# Altium footprint library hphonglib.PcbLib: 1250 footprints (part 3 of 79)
Each footprint in its own frame and in the unit in brackets; x right, y up, seen from the top. Pads: shape width x height; smd on the part's side, far side on the other; paste and mask are expansions set on the pad; w line width, h text height; cw(c..) or ccw(c..) is an arc to the next point about the centre after c.
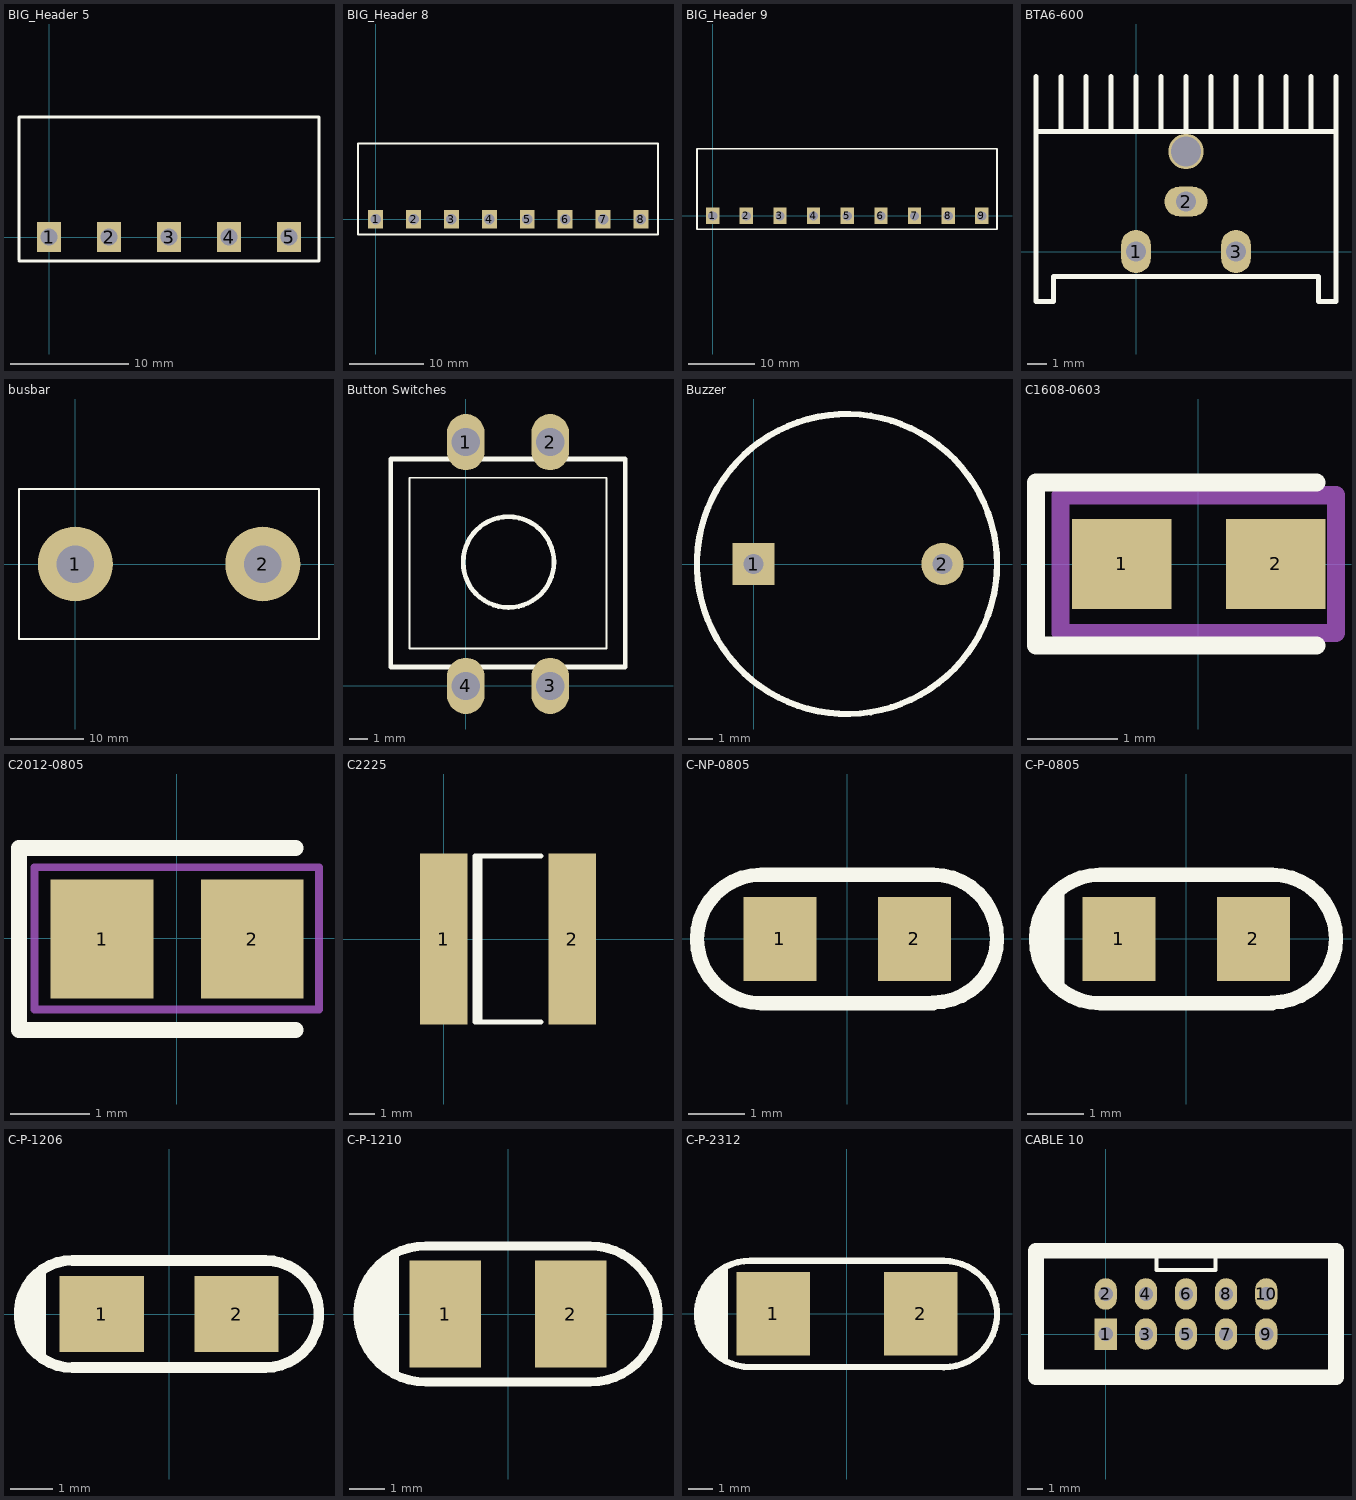
[diagram p2: the footprints below, top view; thin cyan lines are the x and y axes]

## BIG_Header 5 [mm]
pads (5):
  rect 2x2.5 hole 1.4: 1(0,0) 2(5.08,0) 3(10.16,0) 4(15.24,0) 5(20.32,0)
Top Overlay:
  lines w0.254: -2.54,-2.032 7.62,-2.032 22.86,-2.032 22.86,10.16 ; -2.54,-1.905 -2.54,10.16 ; -2.54,10.16 6.248,10.16 22.86,10.16 ; -2.54,10.16 22.86,10.16
3D body "User Library-BigHeader 5EHDR_1P.step": height 3.15, standoff -9.32, extent 17.82,-1.75 22.82,10.25
3D body "User Library-BigHeader 5EHDR_1P.step": height 3.15, standoff -9.32, extent 12.74,-1.75 17.74,10.25
3D body "User Library-BigHeader 5EHDR_1P.step": height 3.15, standoff -9.32, extent 7.66,-1.75 12.66,10.25
3D body "User Library-BigHeader 5EHDR_1P.step": height 3.15, standoff -9.32, extent 2.58,-1.75 7.58,10.25
3D body "User Library-BigHeader 5EHDR_1P.step": height 3.15, standoff -9.32, extent -2.5,-1.75 2.5,10.25

## BIG_Header 8 [mm]
pads (8):
  rect 2x2.5 hole 1.4: 1(0,0) 2(5.08,0) 3(10.16,0) 4(15.24,0) 5(20.32,0) 6(25.4,0) 7(30.48,0) 8(35.56,0)
Top Overlay:
  lines w0.254: 13.843,10.16 37.846,10.16 37.846,-2.032 27.94,-2.032 17.78,-2.032 7.62,-2.032 -2.362,-2.032 -2.362,10.16 17.78,10.16
3D body "User Library-BigHeader 5EHDR_1P.step": height 3.15, standoff -9.32, extent -2.5,-1.75 2.5,10.25
3D body "User Library-BigHeader 5EHDR_1P.step": height 3.15, standoff -9.32, extent 2.58,-1.75 7.58,10.25
3D body "User Library-BigHeader 5EHDR_1P.step": height 3.15, standoff -9.32, extent 7.66,-1.75 12.66,10.25
3D body "User Library-BigHeader 5EHDR_1P.step": height 3.15, standoff -9.32, extent 12.74,-1.75 17.74,10.25
3D body "User Library-BigHeader 5EHDR_1P.step": height 3.15, standoff -9.32, extent 17.82,-1.75 22.82,10.25
3D body "User Library-BigHeader 5EHDR_1P.step": height 3.15, standoff -9.32, extent 22.9,-1.75 27.9,10.25
3D body "User Library-BigHeader 5EHDR_1P.step": height 3.15, standoff -9.32, extent 27.98,-1.75 32.98,10.25
3D body "User Library-BigHeader 5EHDR_1P.step": height 3.15, standoff -9.32, extent 33.06,-1.75 38.06,10.25

## BIG_Header 9 [mm]
pads (9):
  rect 2x2.5 hole 1.4: 1(0,0) 2(5.08,0) 3(10.16,0) 4(15.24,0) 5(20.32,0) 6(25.4,0) 7(30.48,0) 8(35.56,0) 9(40.64,0)
Top Overlay:
  lines w0.254: 13.843,10.16 42.926,10.16 42.926,-2.032 27.94,-2.032 17.78,-2.032 7.62,-2.032 -2.362,-2.032 -2.362,10.16 17.78,10.16
3D body "User Library-BigHeader 5EHDR_1P.step": height 3.15, standoff -9.32, extent -2.5,-1.75 2.5,10.25
3D body "User Library-BigHeader 5EHDR_1P.step": height 3.15, standoff -9.32, extent 2.58,-1.75 7.58,10.25
3D body "User Library-BigHeader 5EHDR_1P.step": height 3.15, standoff -9.32, extent 7.66,-1.75 12.66,10.25
3D body "User Library-BigHeader 5EHDR_1P.step": height 3.15, standoff -9.32, extent 12.74,-1.75 17.74,10.25
3D body "User Library-BigHeader 5EHDR_1P.step": height 3.15, standoff -9.32, extent 17.82,-1.75 22.82,10.25
3D body "User Library-BigHeader 5EHDR_1P.step": height 3.15, standoff -9.32, extent 22.9,-1.75 27.9,10.25
3D body "User Library-BigHeader 5EHDR_1P.step": height 3.15, standoff -9.32, extent 27.98,-1.75 32.98,10.25
3D body "User Library-BigHeader 5EHDR_1P.step": height 3.15, standoff -9.32, extent 33.06,-1.75 38.06,10.25
3D body "User Library-BigHeader 5EHDR_1P.step": height 3.15, standoff -9.32, extent 38.14,-1.75 43.14,10.25

## BTA6-600 [mm] "TRIAC BTA6/6A/600V"
pads (4):
  oval 1.5x2.2 hole 1: 1(0,0) 3(5.08,0)
  oval 2.2x1.5 hole 1: 2(2.54,2.54)
  round 1.8 hole 1.5: ""(2.54,5.08)
Top Overlay:
  lines w0.254: -5.08,6.096 10.16,6.096 ; -5.08,8.89 -5.08,-2.54 -4.191,-2.54 -4.191,-1.27 9.271,-1.27 9.271,-2.54 10.16,-2.54 10.16,8.89 ; -3.81,6.096 -3.81,8.89 ; -2.54,6.096 -2.54,8.89 ; -1.27,6.096 -1.27,8.89 ; 0,6.096 0,8.89 ; 1.27,6.096 1.27,8.89 ; 2.54,6.096 2.54,8.89 ; 3.81,6.096 3.81,8.89 ; 5.08,6.096 5.08,8.89 ; 6.35,6.096 6.35,8.89 ; 7.62,6.096 7.62,8.89 ; 8.89,6.096 8.89,8.89
3D body "User Library-Disipador TO.step": height 20, standoff 0, extent -5.96,2.54 11.04,12.54
3D body "User Library-TO-220-3.step": height 18.7, standoff -10.08, extent -2.41,-2.083 7.49,2.417

## busbar [mm]
pads (2):
  round 10.16 hole 5.08: 1(0,0) 2(25.4,0)
Top Overlay:
  lines w0.254: -7.62,-10.16 33.02,-10.16 33.02,10.16 -7.62,10.16 -7.62,-10.16

## Button Switches [mm]
pads (4):
  oval 2x3 hole 1.5: 1(0,13) 2(4.5,13) 3(4.5,0) 4(0,0)
Top Overlay:
  circle w0.254: c2.279,6.6 r2.421
  lines w0.1: -3,2 7.5,2 7.5,11.1 -3,11.1 -3,2
  lines w0.254: -4,1 -4,12.1 8.5,12.1 8.5,1 -4,1

## Buzzer [mil] "Buzzer; Solder Pad 35mil"
pads (2):
  rect 67x67 hole 32: 1(0,0)
  round 67 hole 32: 2(300,0)
Top Overlay:
  circle w10: c148.29,0 r238.29
3D body "SW3dPS-WST-1203UX.STEP": height 177.17, standoff -379.92, extent -86.21,-236.21 522.21,236.23

## C1608-0603 [mm] "Capacitor Chip 0603 package"
pads (2):
  rect 1.1x1 smd: 1(-0.843,0.001) 2(0.857,0.001)
Top Overlay:
  lines w0.2: 1.307,-0.899 -1.793,-0.899 -1.793,0.901 1.307,0.901
Mechanical 13:
  lines w0.2: -1.524,-0.762 1.524,-0.762 1.524,0.762 -1.524,0.762 -1.524,-0.762
3D body: height 0.81, standoff 0, extent 0.356,-0.432 0.711,0.432
3D body: height 0.81, standoff 0, extent -0.711,-0.432 -0.356,0.432
3D body: height 0.76, standoff 0, extent -0.356,-0.406 0.356,0.406

## C2012-0805 [mm] "Capacitor Chip 0805 package"
pads (2):
  rect 1.3x1.5 smd: 1(-0.945,-0.007) 2(0.955,-0.007)
Top Overlay:
  lines w0.2: 1.505,-1.157 -1.995,-1.157 -1.995,1.143 1.505,1.143
Mechanical 13:
  lines w0.1: -1.8,-0.9 1.8,-0.9 1.8,0.9 -1.8,0.9 -1.8,-0.9
3D body: height 0.76, standoff 0, extent -0.381,-0.572 0.381,0.572
3D body: height 0.79, standoff 0, extent 0.381,-0.584 0.889,0.584
3D body: height 0.79, standoff 0, extent -0.889,-0.584 -0.381,0.584

## C2225 [mm] "Chip Capacitor; Body 5.6 x 6.4 mm (LxW typ)"
height 1.1
pads (2):
  rect 1.9x6.8 smd: 1(0,0) 2(5.1,0)
Top Overlay:
  lines w0.2: 1.44,-3.3 1.44,3.3 ; 3.85,-3.3 1.25,-3.3 1.25,3.3 3.85,3.3

## C-NP-0805 [mm] "Chip Capacitor; Non-polarized; Body 2.0 x 1.3 mm (LxW typ) [2012]"
height 0.65
pads (2):
  rect 1.3x1.5 smd: 1(-1.194,0) 2(1.194,0)
Top Overlay:
  lines w0.254: 1.524,-1.143 -1.524,-1.143 cw(c-1.524,0) -1.524,1.143 1.524,1.143 cw(c1.524,0.007) 1.524,-1.129
3D body "User Library-Chip Capacitor2.step": height 0.79, standoff -0.01, extent -0.8,-0.428 0.8,0.432

## C-P-0805 [mm] "Chip Capacitor; Polarized; Body 2.0 x 1.3 mm (LxW typ) [2012]"
height 0.65
pads (2):
  rect 1.3x1.5 smd: 1(-1.194,0) 2(1.194,0)
Top Overlay:
  lines w0.254: -2.54,-0.508 -2.54,0.508 ; -2.286,-0.762 -2.286,0.762 ; 1.524,-1.143 -1.524,-1.143 cw(c-1.524,0) -1.524,1.143 1.524,1.143 cw(c1.524,0.007) 1.524,-1.129
3D body "User Library-cap_a.step": height 1.61, standoff 0, extent -1.595,-0.8 1.595,0.8

## C-P-1206 [mm] "Chip Capacitor; Body 3.2 x 1.6 mm (LxW typ) [3216]"
height 2.54
pads (2):
  rect 2x1.8 smd: 1(-1.6,0) 2(1.6,0)
Top Overlay:
  lines w0.254: -3.429,-0.508 -3.429,0.508 ; -3.302,-0.762 -3.302,0.762 ; -3.175,-0.889 -3.175,0.889 ; -3.048,-1.016 -3.048,1.016 ; -2.286,-1.276 cw(c-2.286,0) -2.286,1.276 ; -2.286,-1.27 2.286,-1.27 ccw(c2.286,0) 2.286,1.27 -2.286,1.27
3D body "User Library-cap_a.step": height 1.61, standoff 0, extent -1.595,-0.8 1.596,0.8

## C-P-1210 [mm] "Chip Capacitor; Body 3.5 x 2.8 mm (LxW typ) [3528]"
height 2.54
pads (2):
  rect 2x3 smd: 1(-1.753,0) 2(1.753,0)
Top Overlay:
  lines w0.254: -4.064,-0.635 -4.064,0.635 ; -3.937,-0.889 -3.937,0.889 ; -3.81,-1.143 -3.81,1.143 ; -3.683,-1.27 -3.683,1.27 ; -3.556,-1.397 -3.556,1.397 ; -3.429,-1.524 -3.429,1.524 ; -3.302,-1.524 -3.302,1.524 ; -3.175,-1.651 -3.175,1.651 ; -2.286,-1.905 cw(c-2.286,0) -2.286,1.905 2.286,1.905 cw(c2.286,0) 2.286,-1.905 -2.286,-1.905
3D body "User Library-cap_b.step": height 1.91, standoff 0, extent -1.746,-1.4 1.746,1.4

## C-P-2312 [mm] "Chip Capacitor; Polarized; Body 6.0 x 3.2 mm (LxW typ) [6032]"
height 2.54
pads (2):
  rect 3x3.4 smd: 1(-2.997,0) 2(2.997,0)
Top Overlay:
  lines w0.254: -5.969,-0.635 -5.969,0.635 ; -5.842,-0.889 -5.842,0.889 ; -5.715,-1.143 -5.715,1.143 ; -5.588,-1.27 -5.588,1.27 ; -5.461,-1.397 -5.461,1.397 ; -5.334,-1.524 -5.334,1.524 ; -5.207,-1.651 -5.207,1.651 ; -5.08,-1.778 -5.08,1.778 ; -4.953,-1.905 -4.953,1.905 ; 3.937,-2.166 ccw(c3.937,-0.007) 3.937,2.152 ; 3.937,-2.159 -3.937,-2.159 cw(c-3.937,0) -3.937,2.159 3.937,2.159
3D body "User Library-cap_c.step": height 2.51, standoff 0, extent -2.997,-1.6 2.997,1.6

## CABLE 10 [mm] "Connector; Header; 5x2 Position"
pads (10):
  rect 1.4x2 hole 0.9: 1(0,0)
  oval 1.4x2 hole 0.9: 2(0,2.54) 3(2.54,0) 4(2.54,2.54) 5(5.08,0) 6(5.08,2.54) 7(7.62,0) 8(7.62,2.54) 9(10.16,0) 10(10.16,2.54)
Top Overlay:
  lines w0.254: 3.226,5.27 3.226,4.064 5.08,4.064 6.934,4.064 6.934,5.27
  lines w1: -4.42,-2.73 -4.42,5.27 14.58,5.27 14.58,-2.73 -4.42,-2.73
3D body "User Library-Tyco - 5103308-1 (Shrouded Header 2_54mm 10 Pin).step": height 9.86, standoff -3.05, extent -5.08,-3.302 15.24,5.842